# Altium footprint library kalios.PcbLib: 404 footprints (part 12 of 26)
Each footprint in its own frame and in the unit in brackets; x right, y up, seen from the top. Pads: shape width x height; smd on the part's side, far side on the other; paste and mask are expansions set on the pad; w line width, h text height; cw(c..) or ccw(c..) is an arc to the next point about the centre after c.
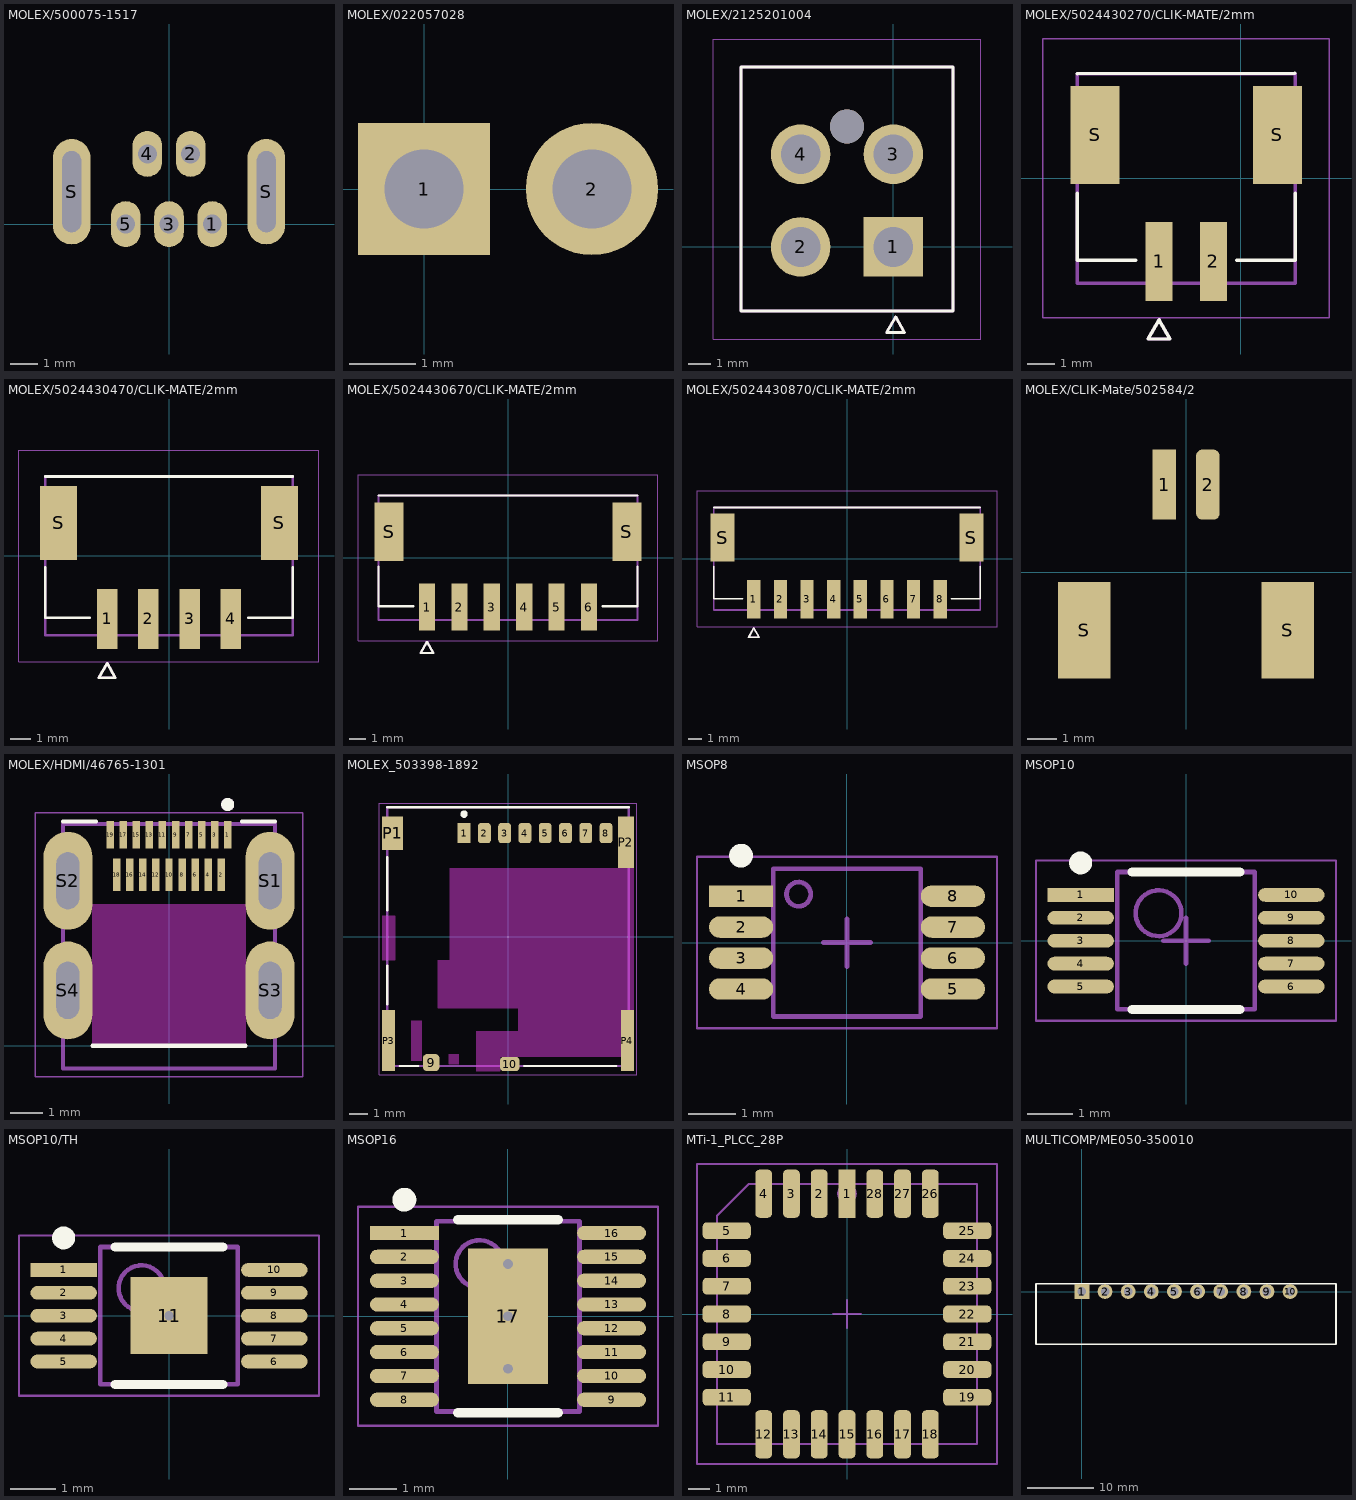
[diagram p11: the footprints below, top view; thin cyan lines are the x and y axes]

## MOLEX/500075-1517 [mm]
pads (7):
  oval 1.1x1.7 hole 0.7: 1(1.6,0) 2(0.8,2.6) 3(0,0) 4(-0.8,2.6) 5(-1.6,0)
  oval 1.4x3.9 hole 0.7 slot 3 at 90 deg: S(-3.6,1.2) S(3.6,1.2)
Top Designator:
  text ".Designator" at -7.618,0.742 h1.52
3D body "5000751517.STEP": height 7.7, standoff -2.1, extent -3.85,-1.1 3.85,3.6

## MOLEX/022057028 [mm]
pads (2):
  rect 2x2 hole 1.2: 1(0,0)
  round 2 hole 1.2: 2(2.54,0)
Top Designator:
  text ".Designator" at -6.322,-7.173 h1.52
3D body "022057028.STEP": height 5.87, standoff -3.77, extent -1.245,-14.433 3.835,0.305

## MOLEX/2125201004 [mm]
pads (5):
  rect 2.7x2.7 hole 1.8 mask+0.076: 1(0,0)
  round 2.7 hole 1.8 mask+0.076: 2(-4.2,0) 3(0,4.2) 4(-4.2,4.2)
  round 1.54 hole 1.54 unplated mask+0.076: ""(-2.1,5.46)
Top Overlay:
  lines w0.127: -6.9,-2.9 -6.9,8.15 2.7,8.15 2.7,-2.9 -6.9,-2.9 ; -0.3,-3.87 0.5,-3.87 0.1,-3.17 -0.3,-3.87
Top Solder:
  circle w0.846: c-2.1,5.46 r0.423
Bottom Solder:
  circle w1.226: c-4.2,0 r0.613
  circle w1.226: c0,4.2 r0.613
  circle w1.226: c-4.2,4.2 r0.613
  region: 1.226,-1.226 -1.226,-1.226 -1.226,1.226 1.226,1.226
Top 3D Body:
  lines w0.127: -6.9,-2.9 -6.9,8.15 2.7,8.15 2.7,-2.9 -6.9,-2.9 ; -0.3,-3.87 0.5,-3.87 0.1,-3.17 -0.3,-3.87
Top Courtyard:
  lines w0.05: -8.17,-4.17 -8.17,9.42 3.97,9.42 3.97,-4.17 -8.17,-4.17
3D body "2125201004.stp.STEP": height 13.85, standoff -3.41, extent -6.909,-2.897 2.691,8.153

## MOLEX/5024430270/CLIK-MATE/2mm [mm]
pads (4):
  rect 1x2.9 smd mask+0.076: 1(-3,-3.05) 2(-1,-3.05)
  rect 1.8x3.6 smd mask+0.076: S(-5.35,1.6) S(1.35,1.6)
Top Overlay:
  lines w0.127: -6,-0.55 -6,-3 -3.85,-3 ; -6,3.85 1.981,3.861 ; -0.15,-3 2,-3 2,-0.55 ; -3.4,-5.9 -2.6,-5.9 -3,-5.2 -3.4,-5.9
Top 3D Body:
  lines w0.127: -6,-3.85 2.007,-3.85 2.007,3.85 -6,3.85 -6,-3.85 ; -3.4,-5.9 -2.6,-5.9 -3,-5.2 -3.4,-5.9
Top Courtyard:
  lines w0.05: -7.27,-5.12 -7.27,5.12 3.251,5.12 3.251,-5.12 -7.27,-5.12
3D body "5024430270.STEP": height -0.43, standoff -7.93, extent -5.956,-3.867 2.044,3.833

## MOLEX/5024430470/CLIK-MATE/2mm [mm]
pads (6):
  rect 1x2.9 smd mask+0.076: 1(-3,-3.05) 2(-1,-3.05) 3(1,-3.05) 4(3,-3.05)
  rect 1.8x3.6 smd mask+0.076: S(-5.35,1.6) S(5.35,1.6)
Top Overlay:
  lines w0.127: -6,-0.55 -6,-3 -3.85,-3 ; -6,3.85 6,3.85 ; 3.85,-3 6,-3 6,-0.55 ; -3.4,-5.9 -2.6,-5.9 -3,-5.2 -3.4,-5.9
Top 3D Body:
  lines w0.127: -6,-3.85 6,-3.85 6,3.85 -6,3.85 -6,-3.85 ; -3.4,-5.9 -2.6,-5.9 -3,-5.2 -3.4,-5.9
Top Courtyard:
  lines w0.05: -7.27,-5.12 -7.27,5.12 7.27,5.12 7.27,-5.12 -7.27,-5.12
3D body "5024430470.stp.STEP": height 7.47, standoff -0.03, extent -6,-3.892 6,3.808

## MOLEX/5024430670/CLIK-MATE/2mm [mm]
pads (8):
  rect 1x2.9 smd mask+0: 1(-5,-3.05) 2(-3,-3.05) 3(-1,-3.05) 4(1,-3.05) 5(3,-3.05) 6(5,-3.05)
  rect 1.8x3.6 smd mask+0: S(-7.35,1.6) S(7.35,1.6)
Top Overlay:
  lines w0.127: -8,-0.55 -8,-3 -5.85,-3 ; -8,3.85 8,3.85 ; 5.85,-3 8,-3 8,-0.55 ; -5.4,-5.9 -5,-5.2 -4.6,-5.9 -5.4,-5.9
Top Solder:
  region: 5.576,-4.576 4.424,-4.576 4.424,-1.524 5.576,-1.524
  region: 3.576,-4.576 2.424,-4.576 2.424,-1.524 3.576,-1.524
  region: 1.576,-4.576 0.424,-4.576 0.424,-1.524 1.576,-1.524
  region: -0.424,-4.576 -1.576,-4.576 -1.576,-1.524 -0.424,-1.524
  region: -4.424,-4.576 -5.576,-4.576 -5.576,-1.524 -4.424,-1.524
  region: -6.374,-0.276 -8.326,-0.276 -8.326,3.476 -6.374,3.476
  region: -2.424,-4.576 -3.576,-4.576 -3.576,-1.524 -2.424,-1.524
  region: 8.326,-0.276 6.374,-0.276 6.374,3.476 8.326,3.476
Top 3D Body:
  lines w0.127: -8,-3.85 -8,3.85 8,3.85 8,-3.85 -8,-3.85 ; -5.4,-5.9 -5,-5.2 -4.6,-5.9 -5.4,-5.9
Top Courtyard:
  lines w0.05: -9.27,-5.12 9.27,-5.12 9.27,5.12 -9.27,5.12 -9.27,-5.12
3D body "5024430670.stp.STEP": height 7.47, standoff -0.03, extent -8,-3.765 8,3.935

## MOLEX/5024430870/CLIK-MATE/2mm [mm]
pads (10):
  rect 1x2.9 smd mask+0: 1(-7,-3.05) 2(-5,-3.05) 3(-3,-3.05) 4(-1,-3.05) 5(1,-3.05) 6(3,-3.05) 7(5,-3.05) 8(7,-3.05)
  rect 1.8x3.6 smd mask+0: S(-9.35,1.6) S(9.35,1.6)
Top Overlay:
  lines w0.127: -10,-0.55 -10,-3 -7.85,-3 ; -10,3.85 10,3.85 ; 7.85,-3 10,-3 10,-0.55 ; -7.4,-5.9 -7,-5.2 -6.6,-5.9 -7.4,-5.9
Top Solder:
  region: 7.576,-4.576 6.424,-4.576 6.424,-1.524 7.576,-1.524
  region: 3.576,-4.576 2.424,-4.576 2.424,-1.524 3.576,-1.524
  region: 5.576,-4.576 4.424,-4.576 4.424,-1.524 5.576,-1.524
  region: 1.576,-4.576 0.424,-4.576 0.424,-1.524 1.576,-1.524
  region: -0.424,-4.576 -1.576,-4.576 -1.576,-1.524 -0.424,-1.524
  region: -2.424,-4.576 -3.576,-4.576 -3.576,-1.524 -2.424,-1.524
  region: -6.424,-4.576 -7.576,-4.576 -7.576,-1.524 -6.424,-1.524
  region: -8.374,-0.276 -10.326,-0.276 -10.326,3.476 -8.374,3.476
  region: -4.424,-4.576 -5.576,-4.576 -5.576,-1.524 -4.424,-1.524
  region: 10.326,-0.276 8.374,-0.276 8.374,3.476 10.326,3.476
Top 3D Body:
  lines w0.127: -10,-3.85 -10,3.85 10,3.85 10,-3.85 -10,-3.85 ; -7.4,-5.9 -7,-5.2 -6.6,-5.9 -7.4,-5.9
Top Courtyard:
  lines w0.05: -11.27,-5.12 11.27,-5.12 11.27,5.12 -11.27,5.12 -11.27,-5.12
3D body "5024430870.stp.STEP": height 7.47, standoff -0.03, extent -10,-3.765 10,3.935

## MOLEX/CLIK-Mate/502584/2 [mm]
pads (4):
  rect 0.8x2.4 smd: 1(-0.75,3)
  rrect50% 0.8x2.4 smd: 2(0.75,3)
  rect 1.8x3.3 smd: S(-3.5,-2) S(3.5,-2)
Top Designator:
  text ".Designator" at -7.618,-0.32 h1.52
3D body "5025840270.STEP": height 7.27, standoff -0.02, extent -3.65,-3.925 3.65,3.475

## MOLEX/HDMI/46765-1301 [mm]
pads (23):
  rect 0.23x0.85 smd: 1(1.8,6.475) 3(1.4,6.475) 5(1,6.475) 7(0.6,6.475) 9(0.2,6.475) 11(-0.2,6.475) 13(-0.6,6.475) 15(-1,6.475) 17(-1.4,6.475) 19(-1.8,6.475)
  rect 0.23x1 smd: 2(1.6,5.25) 4(1.2,5.25) 6(0.8,5.25) 8(0.4,5.25) 10(0,5.25) 12(-0.4,5.25) 14(-0.8,5.25) 16(-1.2,5.25) 18(-1.6,5.25)
  oval 1.5x3 hole 0.7 slot 1.75 at 90 deg: S1(3.1,5.06) S2(-3.1,5.06) S3(3.1,1.7) S4(-3.1,1.7)
Top Overlay:
  circle w0.2: c1.8,7.4 r0.1
  lines w0.127: -3.25,6.88 -2.235,6.88 ; -2.35,0 2.35,0 ; 2.235,6.88 3.25,6.88
Keep-Out Layer:
  region: 2.35,0 -2.35,0 -2.35,4.34 2.35,4.34
  region: 2.35,0 -2.35,0 -2.35,4.34 2.35,4.34
Top 3D Body:
  circle w0.2: c1.8,7.4 r0.1
  lines w0.127: -3.25,-0.7 3.25,-0.7 3.25,6.8 -3.25,6.8 -3.25,0 -3.25,-0.7
Top Courtyard:
  lines w0.05: -4.1,-0.95 -4.1,7.15 4.1,7.15 4.1,-0.95 -4.1,-0.95
Top Designator:
  text ".Designator" at -7.618,2.805 h1.52
3D body "467651301.STEP": height 2.92, standoff -0.6, extent -3.251,-0.702 3.249,6.798

## MOLEX_503398-1892 [mm]
pads (14):
  rect 0.7x1.1 smd: 1(-2.38,5.625)
  rrect50% 0.7x1.1 smd: 2(-1.28,5.625) 3(-0.18,5.625) 4(0.92,5.625) 5(2.02,5.625) 6(3.12,5.625) 7(4.22,5.625) 8(5.32,5.625)
  rrect50% 0.9x0.93 smd: 9(-4.17,-6.84)
  rrect50% 1.05x0.78 smd: 10(0.095,-6.915)
  rect 1.14x1.83 smd: P1(-6.26,5.61)
  rect 0.86x2.8 smd: P2(6.4,5.125)
  rect 0.7x3.33 smd: P3(-6.48,-5.64) P4(6.48,-5.64)
Top Overlay:
  circle w0.2: c-2.388,6.655 r0.1
  lines w0.127: -6.55,-3.675 -6.55,-1.575 ; -6.55,1.425 -6.55,4.325 ; -6.55,7.025 6.55,7.025 ; -5.876,-7.025 -4.874,-7.025 ; 0.874,-7.025 5.876,-7.025
Keep-Out Layer:
  region: 6.83,-3.975 6.13,-3.975 6.13,-6.525 -0.43,-6.525 -0.43,-7.305 -1.73,-7.305 -1.73,-5.125 0.57,-5.125 0.57,-3.875 -3.82,-3.875 -3.82,-1.275 -3.17,-1.275 -3.17,3.725 6.83,3.725
  region: -2.67,-6.937 -3.225,-6.937 -3.225,-6.375 -2.67,-6.375
  region: -4.685,-6.73 -5.239,-6.73 -5.239,-4.575 -4.685,-4.575
  region: -6.13,-1.277 -6.842,-1.277 -6.842,1.125 -6.13,1.125
  region: 6.83,-3.975 6.13,-3.975 6.13,-6.525 -0.43,-6.525 -0.43,-7.305 -1.73,-7.305 -1.73,-5.125 0.57,-5.125 0.57,-3.875 -3.82,-3.875 -3.82,-1.275 -3.17,-1.275 -3.17,3.725 6.83,3.725
  region: -2.67,-6.93 -3.223,-6.93 -3.223,-6.375 -2.67,-6.375
  region: -6.13,-1.276 -6.836,-1.276 -6.836,1.125 -6.13,1.125
  region: -4.685,-6.738 -5.245,-6.738 -5.245,-4.575 -4.685,-4.575
Top 3D Body:
  circle w0.2: c-2.38,5.775 r0.1
  lines w0.127: -6.55,-7.025 -6.55,7.025 6.55,7.025 6.55,-7.025 -6.55,-7.025
Top Courtyard:
  lines w0.05: -7,-7.5 -7,7.25 7,7.25 7,-7.5 -7,-7.5
3D body "Micro SD Card.STEP": height 1.45, standoff 0.34, extent -4.966,-6.213 6.083,8.814
3D body "5033981892--3DModel-STEP-1.STEP": height 1.4, standoff 0, extent -6.55,-7.101 6.55,6.969

## MSOP8 [mm] "TSOP, 8-Leads, Body 3.00x3.00mm, Pitch 0.65mm, IPC Medium Density"
height 0.95
pads (8):
  rect 1.35x0.45 smd: 1(-2.225,0.975)
  oval 1.35x0.45 smd: 2(-2.225,0.325) 3(-2.225,-0.325) 4(-2.225,-0.975) 5(2.225,-0.975) 6(2.225,-0.325) 7(2.225,0.325) 8(2.225,0.975)
Top Overlay:
  circle w0.25: c-2.225,1.825 r0.125
Top 3D Body:
  circle w0.1: c-1.016,1.016 r0.254
  lines w0.1: -1.55,-1.55 1.55,-1.55 1.55,1.55 -1.55,1.55 -1.55,-1.55
Top Courtyard:
  lines w0.05: -3.15,-1.8 3.15,-1.8 3.15,1.8 -3.15,1.8 -3.15,-1.8
  lines w0.1: -0.5,0 0.5,0 ; 0,-0.5 0,0.5
3D body "TSOP65P490X95-8N.step": height 0.95, standoff 0, extent -2.45,-1.55 2.45,1.55

## MSOP10 [mm] "TSSOP, 10-Leads, Body 3.00x3.00mm, Pitch 0.50mm, Thermal Pad 1.68.2x1.68.2mm, IPC Medium Density"
height 1.1
pads (10):
  rect 1.45x0.3 smd: 1(-2.3,1)
  oval 1.45x0.3 smd: 2(-2.3,0.5) 3(-2.3,0) 4(-2.3,-0.5) 5(-2.3,-1) 6(2.3,-1) 7(2.3,-0.5) 8(2.3,0) 9(2.3,0.5) 10(2.3,1)
Top Overlay:
  circle w0.25: c-2.3,1.7 r0.125
  lines w0.2: -1.175,-1.5 1.175,-1.5 ; -1.175,1.5 1.175,1.5
Top 3D Body:
  circle w0.1: c-0.6,0.6 r0.5
  lines w0.1: -1.5,-1.5 1.5,-1.5 1.5,1.5 -1.5,1.5 -1.5,-1.5
Top Courtyard:
  lines w0.05: -3.275,-1.75 3.275,-1.75 3.275,1.75 -3.275,1.75 -3.275,-1.75
  lines w0.1: -0.5,0 0.5,0 ; 0,-0.5 0,0.5
Top Designator:
  text ".Designator" at -7.618,-0.42 h1.52
3D body "MSOP10.STEP": height 1.15, standoff 0, extent -2.45,-1.5 2.45,1.5

## MSOP10/TH [mm] "TSSOP, 10-Leads, Body 3.00x3.00mm, Pitch 0.50mm, Thermal Pad 1.68.2x1.68.2mm, IPC Medium Density"
height 1.1
pads (11):
  rect 1.45x0.3 smd: 1(-2.3,1)
  oval 1.45x0.3 smd: 2(-2.3,0.5) 3(-2.3,0) 4(-2.3,-0.5) 5(-2.3,-1) 6(2.3,-1) 7(2.3,-0.5) 8(2.3,0) 9(2.3,0.5) 10(2.3,1)
  rect 1.68x1.68 smd: 11(0,0)
via 0,0 diameter 0.5 hole 0.2
Top Overlay:
  circle w0.25: c-2.3,1.7 r0.125
  lines w0.2: -1.175,-1.5 1.175,-1.5 ; -1.175,1.5 1.175,1.5
Top 3D Body:
  circle w0.1: c-0.6,0.6 r0.5
  lines w0.1: -1.5,-1.5 1.5,-1.5 1.5,1.5 -1.5,1.5 -1.5,-1.5
Top Courtyard:
  lines w0.05: -3.275,-1.75 3.275,-1.75 3.275,1.75 -3.275,1.75 -3.275,-1.75
  lines w0.1: -0.5,0 0.5,0 ; 0,-0.5 0,0.5
Top Designator:
  text ".Designator" at -7.618,-0.42 h1.52
3D body "MSOP10.STEP": height 1.15, standoff 0, extent -2.45,-1.5 2.45,1.5

## MSOP16 [mm]
height 0.86
pads (17):
  rect 1.45x0.3 smd: 1(-2.175,1.75)
  oval 1.45x0.3 smd: 2(-2.175,1.25) 3(-2.175,0.75) 4(-2.175,0.25) 5(-2.175,-0.25) 6(-2.175,-0.75) 7(-2.175,-1.25) 8(-2.175,-1.75) 9(2.175,-1.75) 10(2.175,-1.25) 11(2.175,-0.75) 12(2.175,-0.25) 13(2.175,0.25) 14(2.175,0.75) 15(2.175,1.25) 16(2.175,1.75)
  rect 1.68x2.85 smd: 17(0,0)
via 0,-1.1 diameter 0.5 hole 0.2
via 0,0 diameter 0.5 hole 0.2
via 0,1.1 diameter 0.5 hole 0.2
Top Overlay:
  circle w0.25: c-2.175,2.45 r0.125
  lines w0.2: -1.05,-2.025 1.05,-2.025 ; -1.05,2.025 1.05,2.025
Top 3D Body:
  circle w0.1: c-0.6,1.1 r0.5
  lines w0.1: -1.5,-2 1.5,-2 1.5,2 -1.5,2 -1.5,-2
Top Courtyard:
  lines w0.05: -3.15,-2.3 3.15,-2.3 3.15,2.3 -3.15,2.3 -3.15,-2.3
  lines w0.1: -0.5,0 0.5,0 ; 0,-0.5 0,0.5
Top Designator:
  text ".Designator" at -7.618,-0.32 h1.52
3D body "User Library-MSOP-16.STEP": height 0.86, standoff 0, extent -2.45,-2.02 2.45,2.019

## MTi-1_PLCC_28P [mm] "MTi-1-series PLCC board"
height 2.55
pads (28):
  rect 0.76x2.2 smd: 1(0,5.5)
  rrect50% 0.76x2.2 smd: 2(-1.27,5.5) 3(-2.54,5.5) 4(-3.81,5.5) 12(-3.81,-5.5) 13(-2.54,-5.5) 14(-1.27,-5.5) 15(0,-5.5) 16(1.27,-5.5) 17(2.54,-5.5) 18(3.81,-5.5) 26(3.81,5.5) 27(2.54,5.5) 28(1.27,5.5)
  rrect50% 2.2x0.76 smd: 5(-5.5,3.81) 6(-5.5,2.54) 7(-5.5,1.27) 8(-5.5,0) 9(-5.5,-1.27) 10(-5.5,-2.54) 11(-5.5,-3.81) 19(5.5,-3.81) 20(5.5,-2.54) 21(5.5,-1.27) 22(5.5,0) 23(5.5,1.27) 24(5.5,2.54) 25(5.5,3.81)
Top Courtyard:
  lines w0.1: -0.635,0 0.635,0 ; 0,-0.635 0,0.635 ; -6.858,-6.858 -6.858,6.858 6.858,6.858 6.858,-6.858 -6.858,-6.858
Mechanical 29:
  circle w0.2: c0,5.5 r0.35
  lines w0.1: -5.95,-5.95 -5.95,4.48 -4.48,5.95 5.95,5.95 5.95,-5.95 -5.95,-5.95
  text ".Designator" at -2.91,-0.41 h1
3D body "MTi-1-SoB_v2.STEP": height 2.6, standoff 0.01, extent -6.05,-6.045 6.05,6.055

## MULTICOMP/ME050-350010 [mm] "Side entry header 3.5mm 12 pol"
height 6.9
pads (10):
  rect 2.25x2.25 hole 1.3: 1(0,0)
  round 2.25 hole 1.3: 2(3.5,0) 3(7,0) 4(10.5,0) 5(14,0) 6(17.5,0) 7(21,0) 8(24.5,0) 9(28,0) 10(31.5,0)
Top Overlay:
  lines w0.254: -6.95,-8 0,-8 31.5,-8 38.45,-8 38.45,1.2 31.5,1.2 0,1.2 -6.95,1.2 -6.95,-8
Top Designator:
  text ".Designator" at 8.132,-4.025 h1.52
3D body "ME050-350010.STEP": height 6.95, standoff -3.45, extent -6.777,-8.362 38.223,0.838